# Altium schematic symbol library jlcpcb_2025_04_capacitors_extended_0402.schlib: 3594 symbols (part 5 of 20) (continued)
## C0402C0G1R5C500NTB
designator C?  Capacitance: 1.5pF  (hidden comment: *)
Capacitor, Ceramic (MLCC), 1.5pF, 50V, C0G, SMD 0402; Manufacturer: EYANG(Shenzhen Eyang Tech Development); Manufacturer Part Number: C0402C0G1R5C500NTB; Package Size: 0402; JLCPCB Basic Part: No; JLCPCB Part Number: C115615; Supplier 1: LCSC; Category: Capacitors - MLCC; Supplier Part Number 1: C115615; Voltage Rating: 50V; Temperature Coefficient: C0G; RoHS: Yes; ComponentLink1Description: Datasheet; ComponentLink1URL: https://datasheet.lcsc.com/lcsc/2304140030_EYANG-Shenzhen-Eyang-Tech-Development-C0402C0G1R5C500NTB_C115615.pdf; ComponentLink2Description: JLCPCB Part URL; ComponentLink2URL: https://jlcpcb.com/partdetail/C115615; ComponentLink3Description: LCSC Part URL; ComponentLink3URL: https://lcsc.com/product-detail/Multilayer-Ceramic-Capacitors-MLCC---SMD-SMT_EYANGShenzhen-Eyang-Tech-Development-EYANGShenzhen-Eyang-Tech-Development-C0402C0G1R5C500NTB_C115615.html
footprint CAP-0402 (0402 (1005M) Capacitor)
pins: 1, 2

## C0402C0G1R8B500NTB
designator C?  Capacitance: 1.8pF  (hidden comment: *)
Capacitor, Ceramic (MLCC), 1.8pF, 50V, C0G, SMD 0402; Manufacturer: EYANG(Shenzhen Eyang Tech Development); Manufacturer Part Number: C0402C0G1R8B500NTB; Package Size: 0402; JLCPCB Basic Part: No; JLCPCB Part Number: C140677; Supplier 1: LCSC; Category: Capacitors - MLCC; Supplier Part Number 1: C140677; Voltage Rating: 50V; Temperature Coefficient: C0G; RoHS: Yes; ComponentLink1Description: Datasheet; ComponentLink1URL: https://datasheet.lcsc.com/lcsc/2304140030_EYANG-Shenzhen-Eyang-Tech-Development-C0402C0G1R8B500NTB_C140677.pdf; ComponentLink2Description: JLCPCB Part URL; ComponentLink2URL: https://jlcpcb.com/partdetail/C140677; ComponentLink3Description: LCSC Part URL; ComponentLink3URL: https://lcsc.com/product-detail/Multilayer-Ceramic-Capacitors-MLCC---SMD-SMT_EYANGShenzhen-Eyang-Tech-Development-EYANGShenzhen-Eyang-Tech-Development-C0402C0G1R8B500NTB_C140677.html
footprint CAP-0402 (0402 (1005M) Capacitor)
pins: 1, 2

## C0402C0G2R0C500NTB
designator C?  Capacitance: 2pF  (hidden comment: *)
Capacitor, Ceramic (MLCC), 2pF, 50V, C0G, SMD 0402; Manufacturer: EYANG(Shenzhen Eyang Tech Development); Manufacturer Part Number: C0402C0G2R0C500NTB; Package Size: 0402; JLCPCB Basic Part: No; JLCPCB Part Number: C115622; Supplier 1: LCSC; Category: Capacitors - MLCC; Supplier Part Number 1: C115622; Voltage Rating: 50V; Temperature Coefficient: C0G; RoHS: Yes; ComponentLink1Description: Datasheet; ComponentLink1URL: https://datasheet.lcsc.com/lcsc/2304140030_EYANG-Shenzhen-Eyang-Tech-Development-C0402C0G2R0C500NTB_C115622.pdf; ComponentLink2Description: JLCPCB Part URL; ComponentLink2URL: https://jlcpcb.com/partdetail/C115622; ComponentLink3Description: LCSC Part URL; ComponentLink3URL: https://lcsc.com/product-detail/Multilayer-Ceramic-Capacitors-MLCC---SMD-SMT_EYANGShenzhen-Eyang-Tech-Development-EYANGShenzhen-Eyang-Tech-Development-C0402C0G2R0C500NTB_C115622.html
footprint CAP-0402 (0402 (1005M) Capacitor)
pins: 1, 2

## C0402C0G2R2B500NTB
designator C?  Capacitance: 2.2pF  (hidden comment: *)
Capacitor, Ceramic (MLCC), 2.2pF, 50V, C0G, SMD 0402; Manufacturer: EYANG(Shenzhen Eyang Tech Development); Manufacturer Part Number: C0402C0G2R2B500NTB; Package Size: 0402; JLCPCB Basic Part: No; JLCPCB Part Number: C140673; Supplier 1: LCSC; Category: Capacitors - MLCC; Supplier Part Number 1: C140673; Voltage Rating: 50V; Temperature Coefficient: C0G; RoHS: Yes; ComponentLink1Description: Datasheet; ComponentLink1URL: https://datasheet.lcsc.com/lcsc/2304140030_EYANG-Shenzhen-Eyang-Tech-Development-C0402C0G2R2B500NTB_C140673.pdf; ComponentLink2Description: JLCPCB Part URL; ComponentLink2URL: https://jlcpcb.com/partdetail/C140673; ComponentLink3Description: LCSC Part URL; ComponentLink3URL: https://lcsc.com/product-detail/Multilayer-Ceramic-Capacitors-MLCC---SMD-SMT_EYANGShenzhen-Eyang-Tech-Development-EYANGShenzhen-Eyang-Tech-Development-C0402C0G2R2B500NTB_C140673.html
footprint CAP-0402 (0402 (1005M) Capacitor)
pins: 1, 2

## C0402C0G2R2C500NTB
designator C?  Capacitance: 2.2pF  (hidden comment: *)
Capacitor, Ceramic (MLCC), 2.2pF, 50V, C0G, SMD 0402; Manufacturer: EYANG(Shenzhen Eyang Tech Development); Manufacturer Part Number: C0402C0G2R2C500NTB; Package Size: 0402; JLCPCB Basic Part: No; JLCPCB Part Number: C115624; Supplier 1: LCSC; Category: Capacitors - MLCC; Supplier Part Number 1: C115624; Voltage Rating: 50V; Temperature Coefficient: C0G; RoHS: Yes; ComponentLink1Description: Datasheet; ComponentLink1URL: https://datasheet.lcsc.com/lcsc/2304140030_EYANG-Shenzhen-Eyang-Tech-Development-C0402C0G2R2C500NTB_C115624.pdf; ComponentLink2Description: JLCPCB Part URL; ComponentLink2URL: https://jlcpcb.com/partdetail/C115624; ComponentLink3Description: LCSC Part URL; ComponentLink3URL: https://lcsc.com/product-detail/Multilayer-Ceramic-Capacitors-MLCC---SMD-SMT_EYANGShenzhen-Eyang-Tech-Development-EYANGShenzhen-Eyang-Tech-Development-C0402C0G2R2C500NTB_C115624.html
footprint CAP-0402 (0402 (1005M) Capacitor)
pins: 1, 2

## C0402C0G2R7B500NTB
designator C?  Capacitance: 2.7pF  (hidden comment: *)
Capacitor, Ceramic (MLCC), 2.7pF, 50V, C0G, SMD 0402; Manufacturer: EYANG(Shenzhen Eyang Tech Development); Manufacturer Part Number: C0402C0G2R7B500NTB; Package Size: 0402; JLCPCB Basic Part: No; JLCPCB Part Number: C140672; Supplier 1: LCSC; Category: Capacitors - MLCC; Supplier Part Number 1: C140672; Voltage Rating: 50V; Temperature Coefficient: C0G; RoHS: Yes; ComponentLink1Description: Datasheet; ComponentLink1URL: https://datasheet.lcsc.com/lcsc/2304140030_EYANG-Shenzhen-Eyang-Tech-Development-C0402C0G2R7B500NTB_C140672.pdf; ComponentLink2Description: JLCPCB Part URL; ComponentLink2URL: https://jlcpcb.com/partdetail/C140672; ComponentLink3Description: LCSC Part URL; ComponentLink3URL: https://lcsc.com/product-detail/Multilayer-Ceramic-Capacitors-MLCC---SMD-SMT_EYANGShenzhen-Eyang-Tech-Development-EYANGShenzhen-Eyang-Tech-Development-C0402C0G2R7B500NTB_C140672.html
footprint CAP-0402 (0402 (1005M) Capacitor)
pins: 1, 2

## C0402C0G3R0C500NTB
designator C?  Capacitance: 3pF  (hidden comment: *)
Capacitor, Ceramic (MLCC), 3pF, 50V, C0G, SMD 0402; Manufacturer: EYANG(Shenzhen Eyang Tech Development); Manufacturer Part Number: C0402C0G3R0C500NTB; Package Size: 0402; JLCPCB Basic Part: No; JLCPCB Part Number: C115630; Supplier 1: LCSC; Category: Capacitors - MLCC; Supplier Part Number 1: C115630; Voltage Rating: 50V; Temperature Coefficient: C0G; RoHS: Yes; ComponentLink1Description: Datasheet; ComponentLink1URL: https://datasheet.lcsc.com/lcsc/2304140030_EYANG-Shenzhen-Eyang-Tech-Development-C0402C0G3R0C500NTB_C115630.pdf; ComponentLink2Description: JLCPCB Part URL; ComponentLink2URL: https://jlcpcb.com/partdetail/C115630; ComponentLink3Description: LCSC Part URL; ComponentLink3URL: https://lcsc.com/product-detail/Multilayer-Ceramic-Capacitors-MLCC---SMD-SMT_EYANGShenzhen-Eyang-Tech-Development-EYANGShenzhen-Eyang-Tech-Development-C0402C0G3R0C500NTB_C115630.html
footprint CAP-0402 (0402 (1005M) Capacitor)
pins: 1, 2

## C0402C0G3R3B500NTB
designator C?  Capacitance: 3.3pF  (hidden comment: *)
Capacitor, Ceramic (MLCC), 3.3pF, 50V, C0G, SMD 0402; Manufacturer: EYANG(Shenzhen Eyang Tech Development); Manufacturer Part Number: C0402C0G3R3B500NTB; Package Size: 0402; JLCPCB Basic Part: No; JLCPCB Part Number: C140667; Supplier 1: LCSC; Category: Capacitors - MLCC; Supplier Part Number 1: C140667; Voltage Rating: 50V; Temperature Coefficient: C0G; RoHS: Yes; ComponentLink1Description: Datasheet; ComponentLink1URL: https://datasheet.lcsc.com/lcsc/2304140030_EYANG-Shenzhen-Eyang-Tech-Development-C0402C0G3R3B500NTB_C140667.pdf; ComponentLink2Description: JLCPCB Part URL; ComponentLink2URL: https://jlcpcb.com/partdetail/C140667; ComponentLink3Description: LCSC Part URL; ComponentLink3URL: https://lcsc.com/product-detail/Multilayer-Ceramic-Capacitors-MLCC---SMD-SMT_EYANGShenzhen-Eyang-Tech-Development-EYANGShenzhen-Eyang-Tech-Development-C0402C0G3R3B500NTB_C140667.html
footprint CAP-0402 (0402 (1005M) Capacitor)
pins: 1, 2

## C0402C0G3R6C500NTB
designator C?  Capacitance: 3.6pF  (hidden comment: *)
Capacitor, Ceramic (MLCC), 3.6pF, 50V, C0G, SMD 0402; Manufacturer: EYANG(Shenzhen Eyang Tech Development); Manufacturer Part Number: C0402C0G3R6C500NTB; Package Size: 0402; JLCPCB Basic Part: No; JLCPCB Part Number: C115632; Supplier 1: LCSC; Category: Capacitors - MLCC; Supplier Part Number 1: C115632; Voltage Rating: 50V; Temperature Coefficient: C0G; RoHS: Yes; ComponentLink1Description: Datasheet; ComponentLink1URL: https://datasheet.lcsc.com/lcsc/2304140030_EYANG-Shenzhen-Eyang-Tech-Development-C0402C0G3R6C500NTB_C115632.pdf; ComponentLink2Description: JLCPCB Part URL; ComponentLink2URL: https://jlcpcb.com/partdetail/C115632; ComponentLink3Description: LCSC Part URL; ComponentLink3URL: https://lcsc.com/product-detail/Multilayer-Ceramic-Capacitors-MLCC---SMD-SMT_EYANGShenzhen-Eyang-Tech-Development-EYANGShenzhen-Eyang-Tech-Development-C0402C0G3R6C500NTB_C115632.html
footprint CAP-0402 (0402 (1005M) Capacitor)
pins: 1, 2

## C0402C0G5R6B500NTB
designator C?  Capacitance: 5.6pF  (hidden comment: *)
Capacitor, Ceramic (MLCC), 5.6pF, 50V, C0G, SMD 0402; Manufacturer: EYANG(Shenzhen Eyang Tech Development); Manufacturer Part Number: C0402C0G5R6B500NTB; Package Size: 0402; JLCPCB Basic Part: No; JLCPCB Part Number: C778375; Supplier 1: LCSC; Category: Capacitors - MLCC; Supplier Part Number 1: C778375; Voltage Rating: 50V; Temperature Coefficient: C0G; RoHS: Yes; ComponentLink1Description: Datasheet; ComponentLink1URL: https://datasheet.lcsc.com/lcsc/2009051610_EYANG-Shenzhen-Eyang-Tech-Development-C0402C0G5R6B500NTB_C778375.pdf; ComponentLink2Description: JLCPCB Part URL; ComponentLink2URL: https://jlcpcb.com/partdetail/C778375; ComponentLink3Description: LCSC Part URL; ComponentLink3URL: https://lcsc.com/product-detail/Multilayer-Ceramic-Capacitors-MLCC---SMD-SMT_EYANGShenzhen-Eyang-Tech-Development-EYANGShenzhen-Eyang-Tech-Development-C0402C0G5R6B500NTB_C778375.html
footprint CAP-0402 (0402 (1005M) Capacitor)
pins: 1, 2

## C0402C0G6R0D500NTB
designator C?  Capacitance: 6pF  (hidden comment: *)
Capacitor, Ceramic (MLCC), 6pF, 50V, C0G, SMD 0402; Manufacturer: EYANG(Shenzhen Eyang Tech Development); Manufacturer Part Number: C0402C0G6R0D500NTB; Package Size: 0402; JLCPCB Basic Part: No; JLCPCB Part Number: C115642; Supplier 1: LCSC; Category: Capacitors - MLCC; Supplier Part Number 1: C115642; Voltage Rating: 50V; Temperature Coefficient: C0G; RoHS: Yes; ComponentLink1Description: Datasheet; ComponentLink1URL: https://datasheet.lcsc.com/lcsc/2304140030_EYANG-Shenzhen-Eyang-Tech-Development-C0402C0G6R0D500NTB_C115642.pdf; ComponentLink2Description: JLCPCB Part URL; ComponentLink2URL: https://jlcpcb.com/partdetail/C115642; ComponentLink3Description: LCSC Part URL; ComponentLink3URL: https://lcsc.com/product-detail/Multilayer-Ceramic-Capacitors-MLCC---SMD-SMT_EYANGShenzhen-Eyang-Tech-Development-EYANGShenzhen-Eyang-Tech-Development-C0402C0G6R0D500NTB_C115642.html
footprint CAP-0402 (0402 (1005M) Capacitor)
pins: 1, 2

## C0402C0G6R8C500NTB
designator C?  Capacitance: 6.8pF  (hidden comment: *)
Capacitor, Ceramic (MLCC), 6.8pF, 50V, C0G, SMD 0402; Manufacturer: EYANG(Shenzhen Eyang Tech Development); Manufacturer Part Number: C0402C0G6R8C500NTB; Package Size: 0402; JLCPCB Basic Part: No; JLCPCB Part Number: C115644; Supplier 1: LCSC; Category: Capacitors - MLCC; Supplier Part Number 1: C115644; Voltage Rating: 50V; Temperature Coefficient: C0G; RoHS: Yes; ComponentLink1Description: Datasheet; ComponentLink1URL: https://datasheet.lcsc.com/lcsc/2304140030_EYANG-Shenzhen-Eyang-Tech-Development-C0402C0G6R8C500NTB_C115644.pdf; ComponentLink2Description: JLCPCB Part URL; ComponentLink2URL: https://jlcpcb.com/partdetail/C115644; ComponentLink3Description: LCSC Part URL; ComponentLink3URL: https://lcsc.com/product-detail/Multilayer-Ceramic-Capacitors-MLCC---SMD-SMT_EYANGShenzhen-Eyang-Tech-Development-EYANGShenzhen-Eyang-Tech-Development-C0402C0G6R8C500NTB_C115644.html
footprint CAP-0402 (0402 (1005M) Capacitor)
pins: 1, 2

## C0402C0G6R8D500NTB
designator C?  Capacitance: 6.8pF  (hidden comment: *)
Capacitor, Ceramic (MLCC), 6.8pF, 50V, C0G, SMD 0402; Manufacturer: EYANG(Shenzhen Eyang Tech Development); Manufacturer Part Number: C0402C0G6R8D500NTB; Package Size: 0402; JLCPCB Basic Part: No; JLCPCB Part Number: C115645; Supplier 1: LCSC; Category: Capacitors - MLCC; Supplier Part Number 1: C115645; Voltage Rating: 50V; Temperature Coefficient: C0G; RoHS: Yes; ComponentLink1Description: Datasheet; ComponentLink1URL: https://datasheet.lcsc.com/lcsc/2304140030_EYANG-Shenzhen-Eyang-Tech-Development-C0402C0G6R8D500NTB_C115645.pdf; ComponentLink2Description: JLCPCB Part URL; ComponentLink2URL: https://jlcpcb.com/partdetail/C115645; ComponentLink3Description: LCSC Part URL; ComponentLink3URL: https://lcsc.com/product-detail/Multilayer-Ceramic-Capacitors-MLCC---SMD-SMT_EYANGShenzhen-Eyang-Tech-Development-EYANGShenzhen-Eyang-Tech-Development-C0402C0G6R8D500NTB_C115645.html
footprint CAP-0402 (0402 (1005M) Capacitor)
pins: 1, 2

## C0402C0G9R0B500NTB
designator C?  Capacitance: 9pF  (hidden comment: *)
Capacitor, Ceramic (MLCC), 9pF, 50V, SMD 0402; Manufacturer: EYANG(Shenzhen Eyang Tech Development); Manufacturer Part Number: C0402C0G9R0B500NTB; Package Size: 0402; JLCPCB Basic Part: No; JLCPCB Part Number: C882011; Supplier 1: LCSC; Category: Capacitors - MLCC; Supplier Part Number 1: C882011; Voltage Rating: 50V; RoHS: Yes; ComponentLink1Description: Datasheet; ComponentLink1URL: https://datasheet.lcsc.com/lcsc/2012231841_EYANG-Shenzhen-Eyang-Tech-Development-C0402C0G9R0B500NTB_C882011.pdf; ComponentLink2Description: JLCPCB Part URL; ComponentLink2URL: https://jlcpcb.com/partdetail/C882011; ComponentLink3Description: LCSC Part URL; ComponentLink3URL: https://lcsc.com/product-detail/Multilayer-Ceramic-Capacitors-MLCC---SMD-SMT_EYANGShenzhen-Eyang-Tech-Development-EYANGShenzhen-Eyang-Tech-Development-C0402C0G9R0B500NTB_C882011.html
footprint CAP-0402 (0402 (1005M) Capacitor)
pins: 1, 2

## C0402C0G100C500NTB
designator C?  Capacitance: 10pF  (hidden comment: *)
Capacitor, Ceramic (MLCC), 10pF, 50V, C0G, SMD 0402; Manufacturer: EYANG(Shenzhen Eyang Tech Development); Manufacturer Part Number: C0402C0G100C500NTB; Package Size: 0402; JLCPCB Basic Part: No; JLCPCB Part Number: C314221; Supplier 1: LCSC; Category: Capacitors - MLCC; Supplier Part Number 1: C314221; Voltage Rating: 50V; Temperature Coefficient: C0G; RoHS: Yes; ComponentLink1Description: Datasheet; ComponentLink1URL: https://datasheet.lcsc.com/lcsc/2304140030_EYANG-Shenzhen-Eyang-Tech-Development-C0402C0G100C500NTB_C314221.pdf; ComponentLink2Description: JLCPCB Part URL; ComponentLink2URL: https://jlcpcb.com/partdetail/C314221; ComponentLink3Description: LCSC Part URL; ComponentLink3URL: https://lcsc.com/product-detail/Multilayer-Ceramic-Capacitors-MLCC---SMD-SMT_EYANGShenzhen-Eyang-Tech-Development-EYANGShenzhen-Eyang-Tech-Development-C0402C0G100C500NTB_C314221.html
footprint CAP-0402 (0402 (1005M) Capacitor)
pins: 1, 2

## C0402C0G100J500NTB
designator C?  Capacitance: 10pF  (hidden comment: *)
Capacitor, Ceramic (MLCC), 10pF, ±5%, 50V, C0G, ±5%, SMD 0402; Manufacturer: EYANG(Shenzhen Eyang Tech Development); Manufacturer Part Number: C0402C0G100J500NTB; Package Size: 0402; JLCPCB Basic Part: No; JLCPCB Part Number: C115606; Supplier 1: LCSC; Category: Capacitors - MLCC; Supplier Part Number 1: C115606; Tolerance: ±5%; Voltage Rating: 50V; Temperature Coefficient: C0G; RoHS: Yes; ComponentLink1Description: Datasheet; ComponentLink1URL: https://datasheet.lcsc.com/lcsc/2304140030_EYANG-Shenzhen-Eyang-Tech-Development-C0402C0G100J500NTB_C115606.pdf; ComponentLink2Description: JLCPCB Part URL; ComponentLink2URL: https://jlcpcb.com/partdetail/C115606; ComponentLink3Description: LCSC Part URL; ComponentLink3URL: https://lcsc.com/product-detail/Multilayer-Ceramic-Capacitors-MLCC---SMD-SMT_EYANGShenzhen-Eyang-Tech-Development-EYANGShenzhen-Eyang-Tech-Development-C0402C0G100J500NTB_C115606.html
footprint CAP-0402 (0402 (1005M) Capacitor)
pins: 1, 2

## C0402C0G101J500NTB
designator C?  Capacitance: 100pF  (hidden comment: *)
Capacitor, Ceramic (MLCC), 100pF, ±5%, 50V, C0G, ±5%, SMD 0402; Manufacturer: EYANG(Shenzhen Eyang Tech Development); Manufacturer Part Number: C0402C0G101J500NTB; Package Size: 0402; JLCPCB Basic Part: No; JLCPCB Part Number: C115607; Supplier 1: LCSC; Category: Capacitors - MLCC; Supplier Part Number 1: C115607; Tolerance: ±5%; Voltage Rating: 50V; Temperature Coefficient: C0G; RoHS: Yes; ComponentLink1Description: Datasheet; ComponentLink1URL: https://datasheet.lcsc.com/lcsc/2304140030_EYANG-Shenzhen-Eyang-Tech-Development-C0402C0G101J500NTB_C115607.pdf; ComponentLink2Description: JLCPCB Part URL; ComponentLink2URL: https://jlcpcb.com/partdetail/C115607; ComponentLink3Description: LCSC Part URL; ComponentLink3URL: https://lcsc.com/product-detail/Multilayer-Ceramic-Capacitors-MLCC---SMD-SMT_EYANGShenzhen-Eyang-Tech-Development-EYANGShenzhen-Eyang-Tech-Development-C0402C0G101J500NTB_C115607.html
footprint CAP-0402 (0402 (1005M) Capacitor)
pins: 1, 2

## C0402C0G130J500NTB
designator C?  Capacitance: 13pF  (hidden comment: *)
Capacitor, Ceramic (MLCC), 13pF, ±5%, 50V, C0G, ±5%, SMD 0402; Manufacturer: EYANG(Shenzhen Eyang Tech Development); Manufacturer Part Number: C0402C0G130J500NTB; Package Size: 0402; JLCPCB Basic Part: No; JLCPCB Part Number: C183717; Supplier 1: LCSC; Category: Capacitors - MLCC; Supplier Part Number 1: C183717; Tolerance: ±5%; Voltage Rating: 50V; Temperature Coefficient: C0G; RoHS: Yes; ComponentLink1Description: Datasheet; ComponentLink1URL: https://datasheet.lcsc.com/lcsc/2304140030_EYANG-Shenzhen-Eyang-Tech-Development-C0402C0G130J500NTB_C183717.pdf; ComponentLink2Description: JLCPCB Part URL; ComponentLink2URL: https://jlcpcb.com/partdetail/C183717; ComponentLink3Description: LCSC Part URL; ComponentLink3URL: https://lcsc.com/product-detail/Multilayer-Ceramic-Capacitors-MLCC---SMD-SMT_EYANGShenzhen-Eyang-Tech-Development-EYANGShenzhen-Eyang-Tech-Development-C0402C0G130J500NTB_C183717.html
footprint CAP-0402 (0402 (1005M) Capacitor)
pins: 1, 2

## C0402C0G150G500NTB
designator C?  Capacitance: 15pF  (hidden comment: *)
Capacitor, Ceramic (MLCC), 15pF, ±2%, 50V, C0G, ±2%, SMD 0402; Manufacturer: EYANG(Shenzhen Eyang Tech Development); Manufacturer Part Number: C0402C0G150G500NTB; Package Size: 0402; JLCPCB Basic Part: No; JLCPCB Part Number: C140684; Supplier 1: LCSC; Category: Capacitors - MLCC; Supplier Part Number 1: C140684; Tolerance: ±2%; Voltage Rating: 50V; Temperature Coefficient: C0G; RoHS: Yes; ComponentLink1Description: Datasheet; ComponentLink1URL: https://datasheet.lcsc.com/lcsc/2304140030_EYANG-Shenzhen-Eyang-Tech-Development-C0402C0G150G500NTB_C140684.pdf; ComponentLink2Description: JLCPCB Part URL; ComponentLink2URL: https://jlcpcb.com/partdetail/C140684; ComponentLink3Description: LCSC Part URL; ComponentLink3URL: https://lcsc.com/product-detail/Multilayer-Ceramic-Capacitors-MLCC---SMD-SMT_EYANGShenzhen-Eyang-Tech-Development-EYANGShenzhen-Eyang-Tech-Development-C0402C0G150G500NTB_C140684.html
footprint CAP-0402 (0402 (1005M) Capacitor)
pins: 1, 2

## C0402C0G150K500NTB
designator C?  Capacitance: 15pF  (hidden comment: *)
Capacitor, Ceramic (MLCC), 15pF, ±10%, 50V, C0G, ±10%, SMD 0402; Manufacturer: EYANG(Shenzhen Eyang Tech Development); Manufacturer Part Number: C0402C0G150K500NTB; Package Size: 0402; JLCPCB Basic Part: No; JLCPCB Part Number: C183719; Supplier 1: LCSC; Category: Capacitors - MLCC; Supplier Part Number 1: C183719; Tolerance: ±10%; Voltage Rating: 50V; Temperature Coefficient: C0G; RoHS: Yes; ComponentLink1Description: Datasheet; ComponentLink1URL: https://datasheet.lcsc.com/lcsc/2304140030_EYANG-Shenzhen-Eyang-Tech-Development-C0402C0G150K500NTB_C183719.pdf; ComponentLink2Description: JLCPCB Part URL; ComponentLink2URL: https://jlcpcb.com/partdetail/C183719; ComponentLink3Description: LCSC Part URL; ComponentLink3URL: https://lcsc.com/product-detail/Multilayer-Ceramic-Capacitors-MLCC---SMD-SMT_EYANGShenzhen-Eyang-Tech-Development-EYANGShenzhen-Eyang-Tech-Development-C0402C0G150K500NTB_C183719.html
footprint CAP-0402 (0402 (1005M) Capacitor)
pins: 1, 2

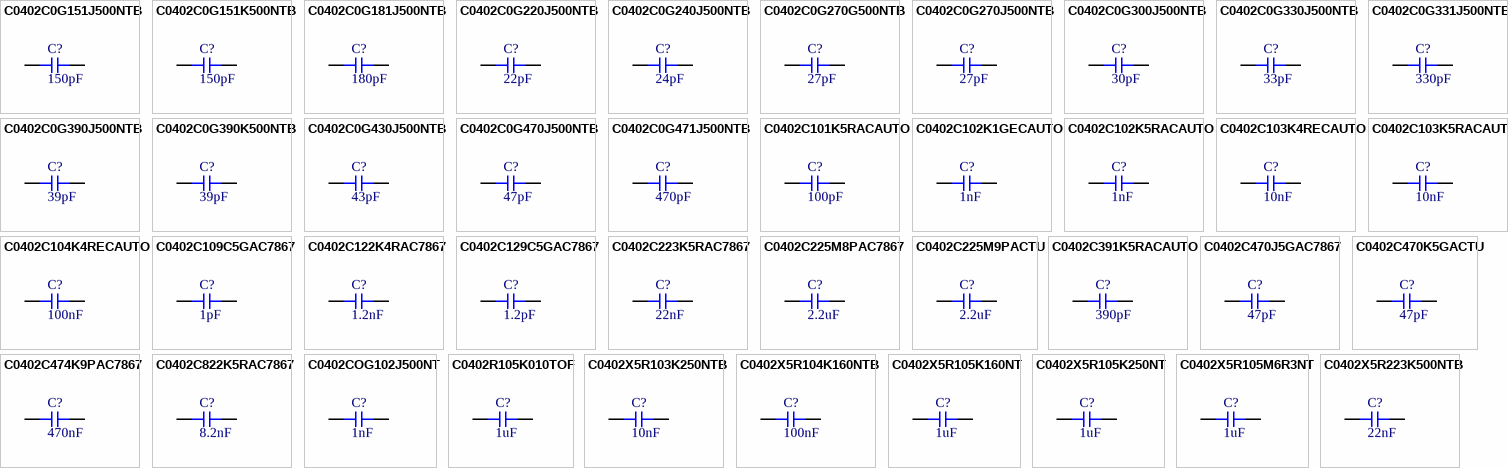
[diagram p20: symbols C0402C0G151J500NTB to C0402X5R223K500NTB]

## C0402C0G151J500NTB
designator C?  Capacitance: 150pF  (hidden comment: *)
Capacitor, Ceramic (MLCC), 150pF, ±5%, 50V, C0G, ±5%, SMD 0402; Manufacturer: EYANG(Shenzhen Eyang Tech Development); Manufacturer Part Number: C0402C0G151J500NTB; Package Size: 0402; JLCPCB Basic Part: No; JLCPCB Part Number: C140683; Supplier 1: LCSC; Category: Capacitors - MLCC; Supplier Part Number 1: C140683; Tolerance: ±5%; Voltage Rating: 50V; Temperature Coefficient: C0G; RoHS: Yes; ComponentLink1Description: Datasheet; ComponentLink1URL: https://datasheet.lcsc.com/lcsc/2304140030_EYANG-Shenzhen-Eyang-Tech-Development-C0402C0G151J500NTB_C140683.pdf; ComponentLink2Description: JLCPCB Part URL; ComponentLink2URL: https://jlcpcb.com/partdetail/C140683; ComponentLink3Description: LCSC Part URL; ComponentLink3URL: https://lcsc.com/product-detail/Multilayer-Ceramic-Capacitors-MLCC---SMD-SMT_EYANGShenzhen-Eyang-Tech-Development-EYANGShenzhen-Eyang-Tech-Development-C0402C0G151J500NTB_C140683.html
footprint CAP-0402 (0402 (1005M) Capacitor)
pins: 1, 2

## C0402C0G151K500NTB
designator C?  Capacitance: 150pF  (hidden comment: *)
Capacitor, Ceramic (MLCC), 150pF, ±10%, 50V, C0G, ±10%, SMD 0402; Manufacturer: EYANG(Shenzhen Eyang Tech Development); Manufacturer Part Number: C0402C0G151K500NTB; Package Size: 0402; JLCPCB Basic Part: No; JLCPCB Part Number: C778387; Supplier 1: LCSC; Category: Capacitors - MLCC; Supplier Part Number 1: C778387; Tolerance: ±10%; Voltage Rating: 50V; Temperature Coefficient: C0G; RoHS: Yes; ComponentLink1Description: Datasheet; ComponentLink1URL: https://datasheet.lcsc.com/lcsc/2009051610_EYANG-Shenzhen-Eyang-Tech-Development-C0402C0G151K500NTB_C778387.pdf; ComponentLink2Description: JLCPCB Part URL; ComponentLink2URL: https://jlcpcb.com/partdetail/C778387; ComponentLink3Description: LCSC Part URL; ComponentLink3URL: https://lcsc.com/product-detail/Multilayer-Ceramic-Capacitors-MLCC---SMD-SMT_EYANGShenzhen-Eyang-Tech-Development-EYANGShenzhen-Eyang-Tech-Development-C0402C0G151K500NTB_C778387.html
footprint CAP-0402 (0402 (1005M) Capacitor)
pins: 1, 2

## C0402C0G181J500NTB
designator C?  Capacitance: 180pF  (hidden comment: *)
Capacitor, Ceramic (MLCC), 180pF, ±5%, 50V, C0G, ±5%, SMD 0402; Manufacturer: EYANG(Shenzhen Eyang Tech Development); Manufacturer Part Number: C0402C0G181J500NTB; Package Size: 0402; JLCPCB Basic Part: No; JLCPCB Part Number: C140681; Supplier 1: LCSC; Category: Capacitors - MLCC; Supplier Part Number 1: C140681; Tolerance: ±5%; Voltage Rating: 50V; Temperature Coefficient: C0G; RoHS: Yes; ComponentLink1Description: Datasheet; ComponentLink1URL: https://datasheet.lcsc.com/lcsc/2304140030_EYANG-Shenzhen-Eyang-Tech-Development-C0402C0G181J500NTB_C140681.pdf; ComponentLink2Description: JLCPCB Part URL; ComponentLink2URL: https://jlcpcb.com/partdetail/C140681; ComponentLink3Description: LCSC Part URL; ComponentLink3URL: https://lcsc.com/product-detail/Multilayer-Ceramic-Capacitors-MLCC---SMD-SMT_EYANGShenzhen-Eyang-Tech-Development-EYANGShenzhen-Eyang-Tech-Development-C0402C0G181J500NTB_C140681.html
footprint CAP-0402 (0402 (1005M) Capacitor)
pins: 1, 2

## C0402C0G220J500NTB
designator C?  Capacitance: 22pF  (hidden comment: *)
Capacitor, Ceramic (MLCC), 22pF, ±5%, 50V, C0G, ±5%, SMD 0402; Manufacturer: EYANG(Shenzhen Eyang Tech Development); Manufacturer Part Number: C0402C0G220J500NTB; Package Size: 0402; JLCPCB Basic Part: No; JLCPCB Part Number: C115618; Supplier 1: LCSC; Category: Capacitors - MLCC; Supplier Part Number 1: C115618; Tolerance: ±5%; Voltage Rating: 50V; Temperature Coefficient: C0G; RoHS: Yes; ComponentLink1Description: Datasheet; ComponentLink1URL: https://datasheet.lcsc.com/lcsc/2304140030_EYANG-Shenzhen-Eyang-Tech-Development-C0402C0G220J500NTB_C115618.pdf; ComponentLink2Description: JLCPCB Part URL; ComponentLink2URL: https://jlcpcb.com/partdetail/C115618; ComponentLink3Description: LCSC Part URL; ComponentLink3URL: https://lcsc.com/product-detail/Multilayer-Ceramic-Capacitors-MLCC---SMD-SMT_EYANGShenzhen-Eyang-Tech-Development-EYANGShenzhen-Eyang-Tech-Development-C0402C0G220J500NTB_C115618.html
footprint CAP-0402 (0402 (1005M) Capacitor)
pins: 1, 2

## C0402C0G240J500NTB
designator C?  Capacitance: 24pF  (hidden comment: *)
Capacitor, Ceramic (MLCC), 24pF, ±5%, 50V, C0G, ±5%, SMD 0402; Manufacturer: EYANG(Shenzhen Eyang Tech Development); Manufacturer Part Number: C0402C0G240J500NTB; Package Size: 0402; JLCPCB Basic Part: No; JLCPCB Part Number: C115620; Supplier 1: LCSC; Category: Capacitors - MLCC; Supplier Part Number 1: C115620; Tolerance: ±5%; Voltage Rating: 50V; Temperature Coefficient: C0G; RoHS: Yes; ComponentLink1Description: Datasheet; ComponentLink1URL: https://datasheet.lcsc.com/lcsc/2304140030_EYANG-Shenzhen-Eyang-Tech-Development-C0402C0G240J500NTB_C115620.pdf; ComponentLink2Description: JLCPCB Part URL; ComponentLink2URL: https://jlcpcb.com/partdetail/C115620; ComponentLink3Description: LCSC Part URL; ComponentLink3URL: https://lcsc.com/product-detail/Multilayer-Ceramic-Capacitors-MLCC---SMD-SMT_EYANGShenzhen-Eyang-Tech-Development-EYANGShenzhen-Eyang-Tech-Development-C0402C0G240J500NTB_C115620.html
footprint CAP-0402 (0402 (1005M) Capacitor)
pins: 1, 2

## C0402C0G270G500NTB
designator C?  Capacitance: 27pF  (hidden comment: *)
Capacitor, Ceramic (MLCC), 27pF, ±2%, 50V, C0G, ±2%, SMD 0402; Manufacturer: EYANG(Shenzhen Eyang Tech Development); Manufacturer Part Number: C0402C0G270G500NTB; Package Size: 0402; JLCPCB Basic Part: No; JLCPCB Part Number: C140675; Supplier 1: LCSC; Category: Capacitors - MLCC; Supplier Part Number 1: C140675; Tolerance: ±2%; Voltage Rating: 50V; Temperature Coefficient: C0G; RoHS: Yes; ComponentLink1Description: Datasheet; ComponentLink1URL: https://datasheet.lcsc.com/lcsc/2304140030_EYANG-Shenzhen-Eyang-Tech-Development-C0402C0G270G500NTB_C140675.pdf; ComponentLink2Description: JLCPCB Part URL; ComponentLink2URL: https://jlcpcb.com/partdetail/C140675; ComponentLink3Description: LCSC Part URL; ComponentLink3URL: https://lcsc.com/product-detail/Multilayer-Ceramic-Capacitors-MLCC---SMD-SMT_EYANGShenzhen-Eyang-Tech-Development-EYANGShenzhen-Eyang-Tech-Development-C0402C0G270G500NTB_C140675.html
footprint CAP-0402 (0402 (1005M) Capacitor)
pins: 1, 2

## C0402C0G270J500NTB
designator C?  Capacitance: 27pF  (hidden comment: *)
Capacitor, Ceramic (MLCC), 27pF, ±5%, 50V, C0G, ±5%, SMD 0402; Manufacturer: EYANG(Shenzhen Eyang Tech Development); Manufacturer Part Number: C0402C0G270J500NTB; Package Size: 0402; JLCPCB Basic Part: No; JLCPCB Part Number: C115621; Supplier 1: LCSC; Category: Capacitors - MLCC; Supplier Part Number 1: C115621; Tolerance: ±5%; Voltage Rating: 50V; Temperature Coefficient: C0G; RoHS: Yes; ComponentLink1Description: Datasheet; ComponentLink1URL: https://datasheet.lcsc.com/lcsc/2304140030_EYANG-Shenzhen-Eyang-Tech-Development-C0402C0G270J500NTB_C115621.pdf; ComponentLink2Description: JLCPCB Part URL; ComponentLink2URL: https://jlcpcb.com/partdetail/C115621; ComponentLink3Description: LCSC Part URL; ComponentLink3URL: https://lcsc.com/product-detail/Multilayer-Ceramic-Capacitors-MLCC---SMD-SMT_EYANGShenzhen-Eyang-Tech-Development-EYANGShenzhen-Eyang-Tech-Development-C0402C0G270J500NTB_C115621.html
footprint CAP-0402 (0402 (1005M) Capacitor)
pins: 1, 2

## C0402C0G300J500NTB
designator C?  Capacitance: 30pF  (hidden comment: *)
Capacitor, Ceramic (MLCC), 30pF, ±5%, 50V, C0G, ±5%, SMD 0402; Manufacturer: EYANG(Shenzhen Eyang Tech Development); Manufacturer Part Number: C0402C0G300J500NTB; Package Size: 0402; JLCPCB Basic Part: No; JLCPCB Part Number: C115627; Supplier 1: LCSC; Category: Capacitors - MLCC; Supplier Part Number 1: C115627; Tolerance: ±5%; Voltage Rating: 50V; Temperature Coefficient: C0G; RoHS: Yes; ComponentLink1Description: Datasheet; ComponentLink1URL: https://datasheet.lcsc.com/lcsc/2304140030_EYANG-Shenzhen-Eyang-Tech-Development-C0402C0G300J500NTB_C115627.pdf; ComponentLink2Description: JLCPCB Part URL; ComponentLink2URL: https://jlcpcb.com/partdetail/C115627; ComponentLink3Description: LCSC Part URL; ComponentLink3URL: https://lcsc.com/product-detail/Multilayer-Ceramic-Capacitors-MLCC---SMD-SMT_EYANGShenzhen-Eyang-Tech-Development-EYANGShenzhen-Eyang-Tech-Development-C0402C0G300J500NTB_C115627.html
footprint CAP-0402 (0402 (1005M) Capacitor)
pins: 1, 2

## C0402C0G330J500NTB
designator C?  Capacitance: 33pF  (hidden comment: *)
Capacitor, Ceramic (MLCC), 33pF, ±5%, 50V, C0G, ±5%, SMD 0402; Manufacturer: EYANG(Shenzhen Eyang Tech Development); Manufacturer Part Number: C0402C0G330J500NTB; Package Size: 0402; JLCPCB Basic Part: No; JLCPCB Part Number: C115628; Supplier 1: LCSC; Category: Capacitors - MLCC; Supplier Part Number 1: C115628; Tolerance: ±5%; Voltage Rating: 50V; Temperature Coefficient: C0G; RoHS: Yes; ComponentLink1Description: Datasheet; ComponentLink1URL: https://datasheet.lcsc.com/lcsc/2304140030_EYANG-Shenzhen-Eyang-Tech-Development-C0402C0G330J500NTB_C115628.pdf; ComponentLink2Description: JLCPCB Part URL; ComponentLink2URL: https://jlcpcb.com/partdetail/C115628; ComponentLink3Description: LCSC Part URL; ComponentLink3URL: https://lcsc.com/product-detail/Multilayer-Ceramic-Capacitors-MLCC---SMD-SMT_EYANGShenzhen-Eyang-Tech-Development-EYANGShenzhen-Eyang-Tech-Development-C0402C0G330J500NTB_C115628.html
footprint CAP-0402 (0402 (1005M) Capacitor)
pins: 1, 2

## C0402C0G331J500NTB
designator C?  Capacitance: 330pF  (hidden comment: *)
Capacitor, Ceramic (MLCC), 330pF, ±5%, 50V, C0G, ±5%, SMD 0402; Manufacturer: EYANG(Shenzhen Eyang Tech Development); Manufacturer Part Number: C0402C0G331J500NTB; Package Size: 0402; JLCPCB Basic Part: No; JLCPCB Part Number: C140670; Supplier 1: LCSC; Category: Capacitors - MLCC; Supplier Part Number 1: C140670; Tolerance: ±5%; Voltage Rating: 50V; Temperature Coefficient: C0G; RoHS: Yes; ComponentLink1Description: Datasheet; ComponentLink1URL: https://datasheet.lcsc.com/lcsc/2304140030_EYANG-Shenzhen-Eyang-Tech-Development-C0402C0G331J500NTB_C140670.pdf; ComponentLink2Description: JLCPCB Part URL; ComponentLink2URL: https://jlcpcb.com/partdetail/C140670; ComponentLink3Description: LCSC Part URL; ComponentLink3URL: https://lcsc.com/product-detail/Multilayer-Ceramic-Capacitors-MLCC---SMD-SMT_EYANGShenzhen-Eyang-Tech-Development-EYANGShenzhen-Eyang-Tech-Development-C0402C0G331J500NTB_C140670.html
footprint CAP-0402 (0402 (1005M) Capacitor)
pins: 1, 2

## C0402C0G390J500NTB
designator C?  Capacitance: 39pF  (hidden comment: *)
Capacitor, Ceramic (MLCC), 39pF, ±5%, 50V, C0G, ±5%, SMD 0402; Manufacturer: EYANG(Shenzhen Eyang Tech Development); Manufacturer Part Number: C0402C0G390J500NTB; Package Size: 0402; JLCPCB Basic Part: No; JLCPCB Part Number: C115629; Supplier 1: LCSC; Category: Capacitors - MLCC; Supplier Part Number 1: C115629; Tolerance: ±5%; Voltage Rating: 50V; Temperature Coefficient: C0G; RoHS: Yes; ComponentLink1Description: Datasheet; ComponentLink1URL: https://datasheet.lcsc.com/lcsc/2304140030_EYANG-Shenzhen-Eyang-Tech-Development-C0402C0G390J500NTB_C115629.pdf; ComponentLink2Description: JLCPCB Part URL; ComponentLink2URL: https://jlcpcb.com/partdetail/C115629; ComponentLink3Description: LCSC Part URL; ComponentLink3URL: https://lcsc.com/product-detail/Multilayer-Ceramic-Capacitors-MLCC---SMD-SMT_EYANGShenzhen-Eyang-Tech-Development-EYANGShenzhen-Eyang-Tech-Development-C0402C0G390J500NTB_C115629.html
footprint CAP-0402 (0402 (1005M) Capacitor)
pins: 1, 2

## C0402C0G390K500NTB
designator C?  Capacitance: 39pF  (hidden comment: *)
Capacitor, Ceramic (MLCC), 39pF, ±10%, 50V, C0G, ±10%, SMD 0402; Manufacturer: EYANG(Shenzhen Eyang Tech Development); Manufacturer Part Number: C0402C0G390K500NTB; Package Size: 0402; JLCPCB Basic Part: No; JLCPCB Part Number: C183723; Supplier 1: LCSC; Category: Capacitors - MLCC; Supplier Part Number 1: C183723; Tolerance: ±10%; Voltage Rating: 50V; Temperature Coefficient: C0G; RoHS: Yes; ComponentLink1Description: Datasheet; ComponentLink1URL: https://datasheet.lcsc.com/lcsc/2304140030_EYANG-Shenzhen-Eyang-Tech-Development-C0402C0G390K500NTB_C183723.pdf; ComponentLink2Description: JLCPCB Part URL; ComponentLink2URL: https://jlcpcb.com/partdetail/C183723; ComponentLink3Description: LCSC Part URL; ComponentLink3URL: https://lcsc.com/product-detail/Multilayer-Ceramic-Capacitors-MLCC---SMD-SMT_EYANGShenzhen-Eyang-Tech-Development-EYANGShenzhen-Eyang-Tech-Development-C0402C0G390K500NTB_C183723.html
footprint CAP-0402 (0402 (1005M) Capacitor)
pins: 1, 2

## C0402C0G430J500NTB
designator C?  Capacitance: 43pF  (hidden comment: *)
Capacitor, Ceramic (MLCC), 43pF, ±5%, 50V, C0G, ±5%, SMD 0402; Manufacturer: EYANG(Shenzhen Eyang Tech Development); Manufacturer Part Number: C0402C0G430J500NTB; Package Size: 0402; JLCPCB Basic Part: No; JLCPCB Part Number: C778336; Supplier 1: LCSC; Category: Capacitors - MLCC; Supplier Part Number 1: C778336; Tolerance: ±5%; Voltage Rating: 50V; Temperature Coefficient: C0G; RoHS: Yes; ComponentLink1Description: Datasheet; ComponentLink1URL: https://datasheet.lcsc.com/lcsc/2009051507_EYANG-Shenzhen-Eyang-Tech-Development-C0402C0G430J500NTB_C778336.pdf; ComponentLink2Description: JLCPCB Part URL; ComponentLink2URL: https://jlcpcb.com/partdetail/C778336; ComponentLink3Description: LCSC Part URL; ComponentLink3URL: https://lcsc.com/product-detail/Multilayer-Ceramic-Capacitors-MLCC---SMD-SMT_EYANGShenzhen-Eyang-Tech-Development-EYANGShenzhen-Eyang-Tech-Development-C0402C0G430J500NTB_C778336.html
footprint CAP-0402 (0402 (1005M) Capacitor)
pins: 1, 2

## C0402C0G470J500NTB
designator C?  Capacitance: 47pF  (hidden comment: *)
Capacitor, Ceramic (MLCC), 47pF, ±5%, 50V, C0G, ±5%, SMD 0402; Manufacturer: EYANG(Shenzhen Eyang Tech Development); Manufacturer Part Number: C0402C0G470J500NTB; Package Size: 0402; JLCPCB Basic Part: No; JLCPCB Part Number: C115634; Supplier 1: LCSC; Category: Capacitors - MLCC; Supplier Part Number 1: C115634; Tolerance: ±5%; Voltage Rating: 50V; Temperature Coefficient: C0G; RoHS: Yes; ComponentLink1Description: Datasheet; ComponentLink1URL: https://datasheet.lcsc.com/lcsc/2304140030_EYANG-Shenzhen-Eyang-Tech-Development-C0402C0G470J500NTB_C115634.pdf; ComponentLink2Description: JLCPCB Part URL; ComponentLink2URL: https://jlcpcb.com/partdetail/C115634; ComponentLink3Description: LCSC Part URL; ComponentLink3URL: https://lcsc.com/product-detail/Multilayer-Ceramic-Capacitors-MLCC---SMD-SMT_EYANGShenzhen-Eyang-Tech-Development-EYANGShenzhen-Eyang-Tech-Development-C0402C0G470J500NTB_C115634.html
footprint CAP-0402 (0402 (1005M) Capacitor)
pins: 1, 2

## C0402C0G471J500NTB
designator C?  Capacitance: 470pF  (hidden comment: *)
Capacitor, Ceramic (MLCC), 470pF, ±5%, 50V, C0G, ±5%, SMD 0402; Manufacturer: EYANG(Shenzhen Eyang Tech Development); Manufacturer Part Number: C0402C0G471J500NTB; Package Size: 0402; JLCPCB Basic Part: No; JLCPCB Part Number: C778372; Supplier 1: LCSC; Category: Capacitors - MLCC; Supplier Part Number 1: C778372; Tolerance: ±5%; Voltage Rating: 50V; Temperature Coefficient: C0G; RoHS: Yes; ComponentLink1Description: Datasheet; ComponentLink1URL: https://datasheet.lcsc.com/lcsc/2009051610_EYANG-Shenzhen-Eyang-Tech-Development-C0402C0G471J500NTB_C778372.pdf; ComponentLink2Description: JLCPCB Part URL; ComponentLink2URL: https://jlcpcb.com/partdetail/C778372; ComponentLink3Description: LCSC Part URL; ComponentLink3URL: https://lcsc.com/product-detail/Multilayer-Ceramic-Capacitors-MLCC---SMD-SMT_EYANGShenzhen-Eyang-Tech-Development-EYANGShenzhen-Eyang-Tech-Development-C0402C0G471J500NTB_C778372.html
footprint CAP-0402 (0402 (1005M) Capacitor)
pins: 1, 2

## C0402C101K5RACAUTO
designator C?  Capacitance: 100pF  (hidden comment: *)
Capacitor, Ceramic (MLCC), 100pF, ±10%, 50V, X7R, ±10%, SMD 0402; Manufacturer: KEMET; Manufacturer Part Number: C0402C101K5RACAUTO; Package Size: 0402; JLCPCB Basic Part: No; JLCPCB Part Number: C141051; Supplier 1: LCSC; Category: Capacitors - MLCC; Supplier Part Number 1: C141051; Tolerance: ±10%; Voltage Rating: 50V; Temperature Coefficient: X7R; RoHS: Yes; ComponentLink1Description: Datasheet; ComponentLink1URL: https://wmsc.lcsc.com/wmsc/upload/file/pdf/v2/lcsc/2304140030_KEMET-C0402C101K5RACAUTO_C141051.pdf; ComponentLink2Description: JLCPCB Part URL; ComponentLink2URL: https://jlcpcb.com/partdetail/C141051; ComponentLink3Description: LCSC Part URL; ComponentLink3URL: https://lcsc.com/product-detail/Multilayer-Ceramic-Capacitors-MLCC---SMD-SMT_KEMET-KEMET-C0402C101K5RACAUTO_C141051.html
footprint CAP-0402 (0402 (1005M) Capacitor)
pins: 1, 2

## C0402C102K1GECAUTO
designator C?  Capacitance: 1nF  (hidden comment: *)
Capacitor, Ceramic (MLCC), 1nF, ±10%, 100V, C0G, ±10%, SMD 0402; Manufacturer: KEMET; Manufacturer Part Number: C0402C102K1GECAUTO; Package Size: 0402; JLCPCB Basic Part: No; JLCPCB Part Number: C696348; Supplier 1: LCSC; Category: Capacitors - MLCC; Supplier Part Number 1: C696348; Tolerance: ±10%; Voltage Rating: 100V; Temperature Coefficient: C0G; RoHS: Yes; ComponentLink1Description: Datasheet; ComponentLink1URL: https://wmsc.lcsc.com/wmsc/upload/file/pdf/v2/lcsc/2304140030_KEMET-C0402C102K1GECAUTO_C696348.pdf; ComponentLink2Description: JLCPCB Part URL; ComponentLink2URL: https://jlcpcb.com/partdetail/C696348; ComponentLink3Description: LCSC Part URL; ComponentLink3URL: https://lcsc.com/product-detail/Multilayer-Ceramic-Capacitors-MLCC---SMD-SMT_KEMET-KEMET-C0402C102K1GECAUTO_C696348.html
footprint CAP-0402 (0402 (1005M) Capacitor)
pins: 1, 2

## C0402C102K5RACAUTO
designator C?  Capacitance: 1nF  (hidden comment: *)
Capacitor, Ceramic (MLCC), 1nF, ±10%, 50V, X7R, ±10%, SMD 0402; Manufacturer: KEMET; Manufacturer Part Number: C0402C102K5RACAUTO; Package Size: 0402; JLCPCB Basic Part: No; JLCPCB Part Number: C141053; Supplier 1: LCSC; Category: Capacitors - MLCC; Supplier Part Number 1: C141053; Tolerance: ±10%; Voltage Rating: 50V; Temperature Coefficient: X7R; RoHS: Yes; ComponentLink1Description: Datasheet; ComponentLink1URL: https://wmsc.lcsc.com/wmsc/upload/file/pdf/v2/lcsc/2304140030_KEMET-C0402C102K5RACAUTO_C141053.pdf; ComponentLink2Description: JLCPCB Part URL; ComponentLink2URL: https://jlcpcb.com/partdetail/C141053; ComponentLink3Description: LCSC Part URL; ComponentLink3URL: https://lcsc.com/product-detail/Multilayer-Ceramic-Capacitors-MLCC---SMD-SMT_KEMET-KEMET-C0402C102K5RACAUTO_C141053.html
footprint CAP-0402 (0402 (1005M) Capacitor)
pins: 1, 2

## C0402C103K4RECAUTO
designator C?  Capacitance: 10nF  (hidden comment: *)
Capacitor, Ceramic (MLCC), 10nF, ±10%, 16V, X7R, ±10%, SMD 0402; Manufacturer: KEMET; Manufacturer Part Number: C0402C103K4RECAUTO; Package Size: 0402; JLCPCB Basic Part: No; JLCPCB Part Number: C696351; Supplier 1: LCSC; Category: Capacitors - MLCC; Supplier Part Number 1: C696351; Tolerance: ±10%; Voltage Rating: 16V; Temperature Coefficient: X7R; RoHS: Yes; ComponentLink1Description: Datasheet; ComponentLink1URL: https://wmsc.lcsc.com/wmsc/upload/file/pdf/v2/lcsc/2304140030_KEMET-C0402C103K4RECAUTO_C696351.pdf; ComponentLink2Description: JLCPCB Part URL; ComponentLink2URL: https://jlcpcb.com/partdetail/C696351; ComponentLink3Description: LCSC Part URL; ComponentLink3URL: https://lcsc.com/product-detail/Multilayer-Ceramic-Capacitors-MLCC---SMD-SMT_KEMET-KEMET-C0402C103K4RECAUTO_C696351.html
footprint CAP-0402 (0402 (1005M) Capacitor)
pins: 1, 2

## C0402C103K5RACAUTO
designator C?  Capacitance: 10nF  (hidden comment: *)
Capacitor, Ceramic (MLCC), 10nF, ±10%, 50V, X7R, ±10%, SMD 0402; Manufacturer: KEMET; Manufacturer Part Number: C0402C103K5RACAUTO; Package Size: 0402; JLCPCB Basic Part: No; JLCPCB Part Number: C599571; Supplier 1: LCSC; Category: Capacitors - MLCC; Supplier Part Number 1: C599571; Tolerance: ±10%; Voltage Rating: 50V; Temperature Coefficient: X7R; RoHS: Yes; ComponentLink1Description: Datasheet; ComponentLink1URL: https://wmsc.lcsc.com/wmsc/upload/file/pdf/v2/lcsc/2304140030_KEMET-C0402C103K5RACAUTO_C599571.pdf; ComponentLink2Description: JLCPCB Part URL; ComponentLink2URL: https://jlcpcb.com/partdetail/C599571; ComponentLink3Description: LCSC Part URL; ComponentLink3URL: https://lcsc.com/product-detail/Multilayer-Ceramic-Capacitors-MLCC---SMD-SMT_KEMET-KEMET-C0402C103K5RACAUTO_C599571.html
footprint CAP-0402 (0402 (1005M) Capacitor)
pins: 1, 2

## C0402C104K4RECAUTO
designator C?  Capacitance: 100nF  (hidden comment: *)
Capacitor, Ceramic (MLCC), 100nF, ±10%, 16V, X7R, ±10%, SMD 0402; Manufacturer: KEMET; Manufacturer Part Number: C0402C104K4RECAUTO; Package Size: 0402; JLCPCB Basic Part: No; JLCPCB Part Number: C696352; Supplier 1: LCSC; Category: Capacitors - MLCC; Supplier Part Number 1: C696352; Tolerance: ±10%; Voltage Rating: 16V; Temperature Coefficient: X7R; RoHS: Yes; ComponentLink1Description: Datasheet; ComponentLink1URL: https://wmsc.lcsc.com/wmsc/upload/file/pdf/v2/lcsc/2304140030_KEMET-C0402C104K4RECAUTO_C696352.pdf; ComponentLink2Description: JLCPCB Part URL; ComponentLink2URL: https://jlcpcb.com/partdetail/C696352; ComponentLink3Description: LCSC Part URL; ComponentLink3URL: https://lcsc.com/product-detail/Multilayer-Ceramic-Capacitors-MLCC---SMD-SMT_KEMET-KEMET-C0402C104K4RECAUTO_C696352.html
footprint CAP-0402 (0402 (1005M) Capacitor)
pins: 1, 2

## C0402C109C5GAC7867
designator C?  Capacitance: 1pF  (hidden comment: *)
Capacitor, Ceramic (MLCC), 1pF, 50V, C0G, SMD 0402; Manufacturer: KEMET; Manufacturer Part Number: C0402C109C5GAC7867; Package Size: 0402; JLCPCB Basic Part: No; JLCPCB Part Number: C599576; Supplier 1: LCSC; Category: Capacitors - MLCC; Supplier Part Number 1: C599576; Voltage Rating: 50V; Temperature Coefficient: C0G; RoHS: Yes; ComponentLink1Description: Datasheet; ComponentLink1URL: https://wmsc.lcsc.com/wmsc/upload/file/pdf/v2/lcsc/2006181133_KEMET-C0402C109C5GAC7867_C599576.pdf; ComponentLink2Description: JLCPCB Part URL; ComponentLink2URL: https://jlcpcb.com/partdetail/C599576; ComponentLink3Description: LCSC Part URL; ComponentLink3URL: https://lcsc.com/product-detail/Multilayer-Ceramic-Capacitors-MLCC---SMD-SMT_KEMET-KEMET-C0402C109C5GAC7867_C599576.html
footprint CAP-0402 (0402 (1005M) Capacitor)
pins: 1, 2

## C0402C122K4RAC7867
designator C?  Capacitance: 1.2nF  (hidden comment: *)
Capacitor, Ceramic (MLCC), 1.2nF, ±10%, 16V, X7R, ±10%, SMD 0402; Manufacturer: KEMET; Manufacturer Part Number: C0402C122K4RAC7867; Package Size: 0402; JLCPCB Basic Part: No; JLCPCB Part Number: C141057; Supplier 1: LCSC; Category: Capacitors - MLCC; Supplier Part Number 1: C141057; Tolerance: ±10%; Voltage Rating: 16V; Temperature Coefficient: X7R; RoHS: Yes; ComponentLink1Description: Datasheet; ComponentLink1URL: https://wmsc.lcsc.com/wmsc/upload/file/pdf/v2/lcsc/2304140030_KEMET-C0402C122K4RAC7867_C141057.pdf; ComponentLink2Description: JLCPCB Part URL; ComponentLink2URL: https://jlcpcb.com/partdetail/C141057; ComponentLink3Description: LCSC Part URL; ComponentLink3URL: https://lcsc.com/product-detail/Multilayer-Ceramic-Capacitors-MLCC---SMD-SMT_KEMET-KEMET-C0402C122K4RAC7867_C141057.html
footprint CAP-0402 (0402 (1005M) Capacitor)
pins: 1, 2

## C0402C129C5GAC7867
designator C?  Capacitance: 1.2pF  (hidden comment: *)
Capacitor, Ceramic (MLCC), 1.2pF, 50V, C0G, SMD 0402; Manufacturer: KEMET; Manufacturer Part Number: C0402C129C5GAC7867; Package Size: 0402; JLCPCB Basic Part: No; JLCPCB Part Number: C140935; Supplier 1: LCSC; Category: Capacitors - MLCC; Supplier Part Number 1: C140935; Voltage Rating: 50V; Temperature Coefficient: C0G; RoHS: Yes; ComponentLink1Description: Datasheet; ComponentLink1URL: https://wmsc.lcsc.com/wmsc/upload/file/pdf/v2/lcsc/2304140030_KEMET-C0402C129C5GAC7867_C140935.pdf; ComponentLink2Description: JLCPCB Part URL; ComponentLink2URL: https://jlcpcb.com/partdetail/C140935; ComponentLink3Description: LCSC Part URL; ComponentLink3URL: https://lcsc.com/product-detail/Multilayer-Ceramic-Capacitors-MLCC---SMD-SMT_KEMET-KEMET-C0402C129C5GAC7867_C140935.html
footprint CAP-0402 (0402 (1005M) Capacitor)
pins: 1, 2
